# Altium footprint library Basal.PcbLib: 248 footprints (part 2 of 16)
Each footprint in its own frame and in the unit in brackets; x right, y up, seen from the top. Pads: shape width x height; smd on the part's side, far side on the other; paste and mask are expansions set on the pad; w line width, h text height; cw(c..) or ccw(c..) is an arc to the next point about the centre after c.
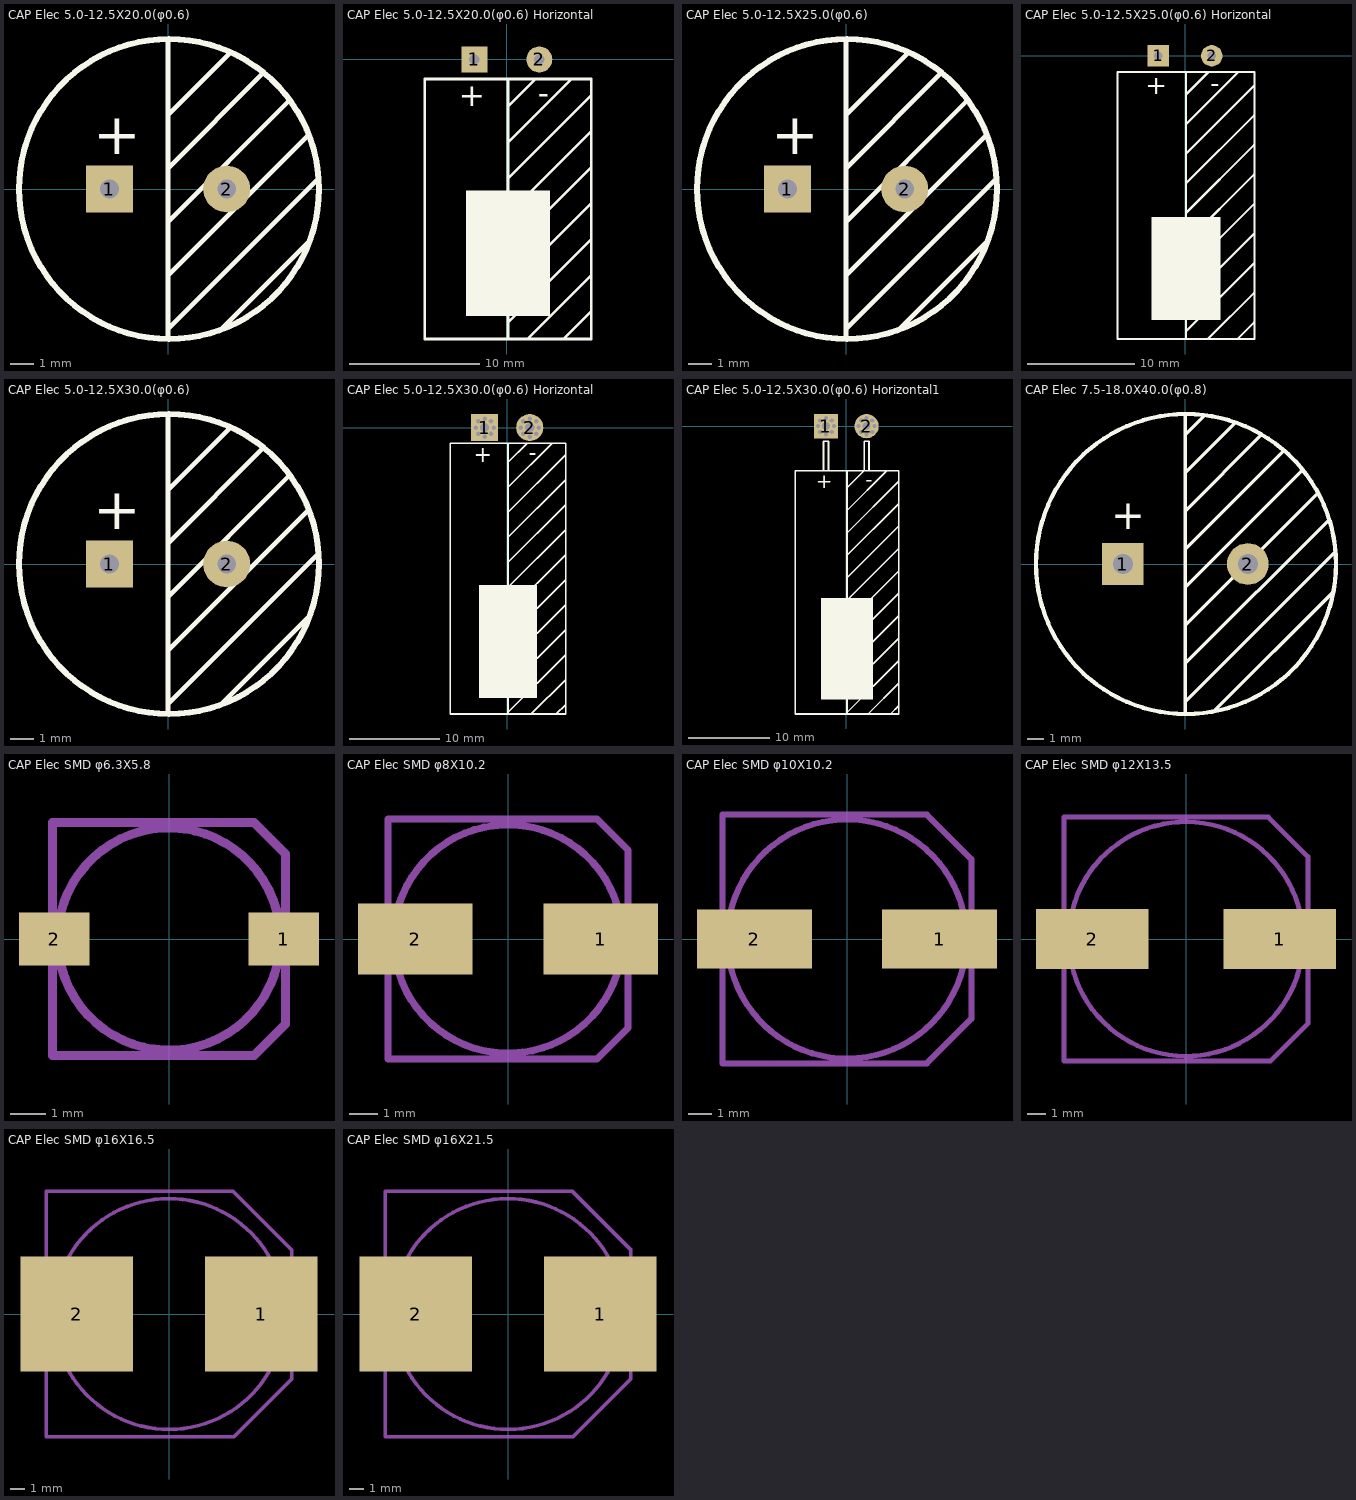
[diagram p1: the footprints below, top view; thin cyan lines are the x and y axes]

## CAP Elec 5.0-12.5X20.0(φ0.6) [mm]
pads (2):
  rect 2x2 hole 0.8: 1(-2.5,0)
  round 2 hole 0.8: 2(2.5,0)
Top Overlay:
  circle w0.254: c0.04,0 r6.4
  lines w0.2: 0,-6.401 0,6.401 ; 0,-5.969 6.426,0.457 ; 0,-3.683 6.007,2.324 ; 0,-1.397 5.194,3.797 ; 0,0.889 4.089,4.978 ; 0,3.175 2.667,5.842 ; 2.235,-6.02 6.007,-2.248
  text "+" at -3.2,0.889 h3.05
3D body "5.0 - 12.5 x 20.0.STEP": height 20, standoff -7.5, extent -6.25,-6.25 6.25,6.25

## CAP Elec 5.0-12.5X20.0(φ0.6) Horizontal [mm]
pads (2):
  rect 2x2 hole 0.8: 1(-2.5,0)
  round 2 hole 0.8: 2(2.5,0)
Top Overlay:
  region: 3.309,-19.74 3.309,-10.088 -3.129,-10.088 -3.129,-19.74
  lines w0.203: 0.09,-21.5 0.09,-1.507 ; 0.09,-20.244 6.478,-13.856 ; 0.09,-17.475 6.478,-11.087 ; 0.09,-14.707 6.478,-8.319 ; 0.09,-11.938 6.478,-5.55 ; 0.09,-9.169 6.478,-2.782 ; 0.09,-6.401 4.976,-1.516 ; 0.09,-3.632 0.09,-3.614 2.198,-1.507 ; 1.607,-21.496 6.478,-16.625 ; 4.37,-21.501 6.478,-19.393 ; 6.49,-21.5 -6.31,-21.5 -6.31,-1.507 6.491,-1.507 ; 6.49,-21.488 6.49,-1.507
  text "-" at 3.251,-1.473 h3.05
  text "+" at -1.649,-1.473 h3.05
3D body: height 4.4, standoff 3.8, extent -2.783,-2.096 -2.173,0.318
3D body: height 4.4, standoff -2, extent -2.783,-0.267 -2.173,0.318
3D body: height 4.4, standoff 3.8, extent 2.195,-2.121 2.805,0.292
3D body: height 4.4, standoff -2, extent 2.195,-0.292 2.805,0.292
3D body: height 12.8, standoff 0, extent -6.298,-21.498 6.502,-1.498

## CAP Elec 5.0-12.5X25.0(φ0.6) [mm]
pads (2):
  rect 2x2 hole 0.8: 1(-2.5,0)
  round 2 hole 0.8: 2(2.5,0)
Top Overlay:
  circle w0.254: c0.04,0 r6.4
  lines w0.2: 0,-6.401 0,6.401 ; 0,-5.969 6.426,0.457 ; 0,-3.683 6.007,2.324 ; 0,-1.397 5.194,3.797 ; 0,0.889 4.089,4.978 ; 0,3.175 2.667,5.842 ; 2.235,-6.02 6.007,-2.248
  text "+" at -3.2,0.889 h3.05
3D body: height 25.5, standoff -3.5, extent -6.25,-6.249 6.252,6.25

## CAP Elec 5.0-12.5X25.0(φ0.6) Horizontal [mm]
pads (2):
  rect 2x2 hole 0.8: 1(-2.5,0)
  round 2 hole 0.8: 2(2.5,0)
Top Overlay:
  region: 3.309,-24.74 3.309,-15.088 -3.129,-15.088 -3.129,-24.74
  lines w0.203: 0.09,-26.5 0.09,-1.507 ; 0.09,-25.781 6.478,-19.393 ; 0.09,-23.012 6.478,-16.625 ; 0.09,-20.244 6.478,-13.856 ; 0.09,-17.475 6.478,-11.087 ; 0.09,-14.707 6.478,-8.319 ; 0.09,-11.938 6.478,-5.55 ; 0.09,-9.169 6.478,-2.782 ; 0.09,-6.401 4.976,-1.516 ; 0.09,-3.632 0.09,-3.614 2.198,-1.507 ; 2.153,-26.487 6.478,-22.162 ; 4.922,-26.487 6.478,-24.93 ; 6.49,-1.507 6.49,-26.5 -6.31,-26.5 -6.31,-1.507 6.491,-1.507
  text "+" at -1.649,-1.473 h3.05
  text "-" at 3.251,-1.473 h3.05
3D body: height 12.8, standoff 0, extent -6.298,-26.498 6.502,-1.498
3D body: height 4.4, standoff -2, extent 2.195,-0.292 2.805,0.292
3D body: height 4.4, standoff 3.8, extent 2.195,-2.121 2.805,0.292
3D body: height 4.4, standoff -2, extent -2.783,-0.267 -2.173,0.318
3D body: height 4.4, standoff 3.8, extent -2.783,-2.096 -2.173,0.318

## CAP Elec 5.0-12.5X30.0(φ0.6) [mm]
pads (2):
  rect 2x2 hole 0.8: 1(-2.5,0)
  round 2 hole 0.8: 2(2.5,0)
Top Overlay:
  circle w0.254: c0.04,0 r6.4
  lines w0.2: 0,-6.401 0,6.401 ; 0,-5.969 6.426,0.457 ; 0,-3.683 6.007,2.324 ; 0,-1.397 5.194,3.797 ; 0,0.889 4.089,4.978 ; 0,3.175 2.667,5.842 ; 2.235,-6.02 6.007,-2.248
  text "+" at -3.2,0.889 h3.05
3D body "5.0 - 12.5 x 20.0.STEP": height 20, standoff -7.5, extent -6.25,-6.25 6.25,6.25
3D body "5.0 - 12.5 x 20.0.STEP": height 30, standoff 2.5, extent -6.25,-6.25 6.25,6.25

## CAP Elec 5.0-12.5X30.0(φ0.6) Horizontal [mm]
pads (18):
  round 0.8 hole 0.5: 1(-3.5,0) 1(-3.207,-0.707) 1(-3.207,0.707) 1(-2.5,-1) 1(-2.5,1) 1(-1.793,-0.707) 1(-1.793,0.707) 1(-1.5,0) 2(1.5,0) 2(1.793,-0.707) 2(1.793,0.707) 2(2.5,-1) 2(2.5,1) 2(3.207,-0.707) 2(3.207,0.707) 2(3.5,0)
  rect 3x3 hole 1: 1(-2.5,0)
  round 3 hole 1: 2(2.5,0)
Top Overlay:
  region: 3.309,-29.968 3.309,-17.45 -3.129,-17.45 -3.129,-29.968
  lines w0.203: 0.09,-31.729 0.09,-1.735 ; 0.09,-31.547 6.478,-25.159 ; 0.09,-28.778 6.478,-22.39 ; 0.09,-26.01 6.478,-19.622 ; 0.09,-23.241 6.478,-16.853 ; 0.09,-20.472 6.478,-14.085 ; 0.09,-17.704 6.478,-11.316 ; 0.09,-14.935 6.478,-8.547 ; 0.09,-12.167 6.478,-5.779 ; 0.09,-9.398 6.478,-3.01 ; 0.09,-6.629 4.976,-1.744 ; 0.09,-3.861 0.09,-3.843 2.198,-1.735 ; 2.685,-31.721 6.478,-27.928 ; 5.453,-31.721 6.478,-30.696 ; 6.49,-1.735 6.49,-31.729 -6.31,-31.729 -6.31,-1.735 6.491,-1.735
  text "-" at 3.251,-1.702 h3.05
  text "+" at -1.649,-1.702 h3.05
3D body: height 4.4, standoff 3.8, extent -2.783,-2.096 -2.173,0.318
3D body: height 4.4, standoff -2, extent -2.783,-0.267 -2.173,0.318
3D body: height 4.4, standoff 3.8, extent 2.195,-2.121 2.805,0.292
3D body: height 4.4, standoff -2, extent 2.195,-0.292 2.805,0.292
3D body: height 12.8, standoff 0, extent -6.298,-31.727 6.502,-1.727

## CAP Elec 5.0-12.5X30.0(φ0.6) Horizontal1 [mm]
pads (18):
  round 0.8 hole 0.5: 1(-3.5,0) 1(-3.207,-0.707) 1(-3.207,0.707) 1(-2.5,-1) 1(-2.5,1) 1(-1.793,-0.707) 1(-1.793,0.707) 1(-1.5,0) 2(1.5,0) 2(1.793,-0.707) 2(1.793,0.707) 2(2.5,-1) 2(2.5,1) 2(3.207,-0.707) 2(3.207,0.707) 2(3.5,0)
  rect 3x3 hole 1: 1(-2.5,0)
  round 3 hole 1: 2(2.5,0)
Top Overlay:
  region: 3.309,-33.74 3.309,-21.221 -3.129,-21.221 -3.129,-33.74
  lines w0.203: -2.8,-5.507 -2.8,-1.866 -2.2,-1.866 -2.2,-5.507 ; 0.09,-35.5 0.09,-5.507 ; 0.09,-35.318 6.478,-28.93 ; 0.09,-32.55 6.478,-26.162 ; 0.09,-29.781 6.478,-23.393 ; 0.09,-27.012 6.478,-20.625 ; 0.09,-24.244 6.478,-17.856 ; 0.09,-21.475 6.478,-15.087 ; 0.09,-18.707 6.478,-12.319 ; 0.09,-15.938 6.478,-9.55 ; 0.09,-13.169 6.478,-6.782 ; 0.09,-10.401 4.976,-5.516 ; 0.09,-7.632 0.09,-7.614 2.198,-5.507 ; 2.2,-5.507 2.2,-1.866 2.8,-1.866 2.8,-5.507 ; 2.685,-35.492 6.478,-31.699 ; 5.453,-35.492 6.478,-34.468 ; 6.49,-5.507 6.49,-35.5 -6.31,-35.5 -6.31,-5.507 6.491,-5.507
  text "-" at 3.251,-5.473 h3.05
  text "+" at -1.649,-5.473 h3.05
3D body: height 4.4, standoff 3.8, extent -2.783,-6.833 -2.173,0.318
3D body: height 4.4, standoff -2, extent -2.783,-0.267 -2.173,0.318
3D body: height 4.4, standoff 3.8, extent 2.195,-7.01 2.805,0.292
3D body: height 4.4, standoff -2, extent 2.195,-0.292 2.805,0.292
3D body: height 12.8, standoff 0, extent -6.298,-35.498 6.502,-5.498

## CAP Elec 7.5-18.0X40.0(φ0.8) [mm]
pads (2):
  rect 2.5x2.5 hole 1.2: 1(-3.75,0)
  round 2.5 hole 1.2: 2(3.75,0)
Top Overlay:
  circle w0.254: c0.04,0 r9
  lines w0.2: 0,-9 0,9 ; 0,-8.255 9.03,0.775 ; 0,-5.969 8.636,2.667 ; 0,-3.683 7.963,4.28 ; 0,-1.397 7.048,5.651 ; 0,0.889 5.918,6.807 ; 0,3.175 4.597,7.772 ; 0,5.461 3.035,8.496 ; 0,7.747 1.194,8.941 ; 1.689,-8.852 8.89,-1.651
  text "+" at -4.45,1.473 h3.05
3D body "7.5 x 18 x 40.STEP": height 41.36, standoff -2.78, extent -9.14,-9.138 9.14,9.138

## CAP Elec SMD D X H [mm]

## CAP Elec SMD φ6.3X5.8 [mm]
pads (2):
  rect 2x1.5 smd: 1(3.25,0) 2(-3.25,0)
Mechanical 15:
  lines w0.254: -2.507,-1.907 cw(c0,0) -2.504,-1.911 ; -3.3,-3.3 2.415,-3.3 3.3,-2.415 3.3,2.415 2.415,3.3 -3.3,3.3 -3.3,-3.3
  text "+" at 0.813,-2.464 h3.05
3D body: height 5.4, standoff 0, extent -3.474,-3.3 3.526,3.3

## CAP Elec SMD φ8X10.2 [mm]
pads (2):
  rect 4x2.5 smd: 1(3.25,0) 2(-3.25,0)
Mechanical 15:
  lines w0.254: -3.184,-2.421 cw(c0,0) -3.18,-2.427 ; -4.2,-4.2 3.115,-4.2 4.2,-3.115 4.2,3.115 3.115,4.2 -4.2,4.2 -4.2,-4.2
  text "+" at 1.321,-3.302 h3.05
3D body "8 x 10.2.STEP": height 10.25, standoff 0.05, extent -5,-4.15 5,4.15

## CAP Elec SMD φ10X10.2 [mm]
pads (2):
  rect 4.8x2.45 smd: 1(3.873,0) 2(-3.873,0)
Mechanical 15:
  lines w0.254: -3.98,-3.027 cw(c0,0) -3.975,-3.033 ; -5.2,-5.2 3.344,-5.2 5.2,-3.344 5.2,3.344 3.344,5.2 -5.2,5.2 -5.2,-5.2
  text "+" at 2.438,-3.454 h3.05
3D body "User Library-CL_series_size10x10.STEP": height 10, standoff 0, extent -5.45,-5.15 5.45,5.15

## CAP Elec SMD φ12X13.5 [mm]
pads (2):
  rect 6x3.2 smd: 1(5,0) 2(-5,0)
Mechanical 15:
  lines w0.254: -4.975,-3.784 cw(c0,0) -4.968,-3.792 ; -6.5,-6.5 -6.5,6.5 4.397,6.5 6.5,4.397 6.5,-4.524 4.524,-6.5 -6.5,-6.5
  text "+" at 2.286,-3.886 h3.05
3D body: height 13.7, standoff 0.2, extent -6.25,-6.248 6.25,6.248
3D body: height 3, standoff 0.1, extent -6.502,-6.5 4.5,6.5
3D body: height 3, standoff 0.1, extent 4.5,-4.5 6.5,4.5
3D body: height 3, standoff 0.1, extent 4.498,4.496 6.502,6.5
3D body: height 3, standoff 0.1, extent 4.496,-6.502 6.5,-4.498

## CAP Elec SMD φ16X16.5 [mm]
pads (2):
  rect 7.8x8 smd: 1(6.4,0) 2(-6.4,0)
Mechanical 15:
  lines w0.254: -6.368,-4.843 cw(c0,0) -6.36,-4.853 ; -8.5,-8.5 4.53,-8.5 8.5,-4.53 8.5,4.454 4.454,8.5 -8.5,8.5 -8.5,-8.5
  text "+" at 2.642,-6.248 h3.05
3D body "16 x 17.STEP": height 17, standoff -0.2, extent -8.65,-8.15 8.65,8.15

## CAP Elec SMD φ16X21.5 [mm]
pads (2):
  rect 7.8x8 smd: 1(6.4,0) 2(-6.4,0)
Mechanical 15:
  lines w0.254: -6.368,-4.843 cw(c0,0) -6.36,-4.853 ; -8.5,-8.5 4.53,-8.5 8.5,-4.53 8.5,4.479 4.479,8.5 -8.5,8.5 -8.5,-8.5
  text "+" at 2.692,-6.375 h3.05
3D body: height 3, standoff 0.1, extent 4.5,4.5 8.5,8.5
3D body: height 3, standoff 0.1, extent 4.5,-8.5 8.5,-4.5
3D body: height 13.7, standoff 0.2, extent -8,-7.998 8,7.998
3D body: height 3, standoff 0.1, extent -8.5,-8.5 4.5,8.5
3D body: height 3, standoff 0.1, extent 4.5,-4.5 8.5,4.5
3D body: height 3, standoff 0.1, extent 4.496,-6.502 6.5,-4.498

## CAP Film 1TYPE F - L X W (X H)(φd) [mm]